# Altium footprint library pads.PcbLib: 25 footprints (part 1 of 2)
Each footprint in its own frame and in the unit in brackets; x right, y up, seen from the top. Pads: shape width x height; smd on the part's side, far side on the other; paste and mask are expansions set on the pad; w line width, h text height; cw(c..) or ccw(c..) is an arc to the next point about the centre after c.
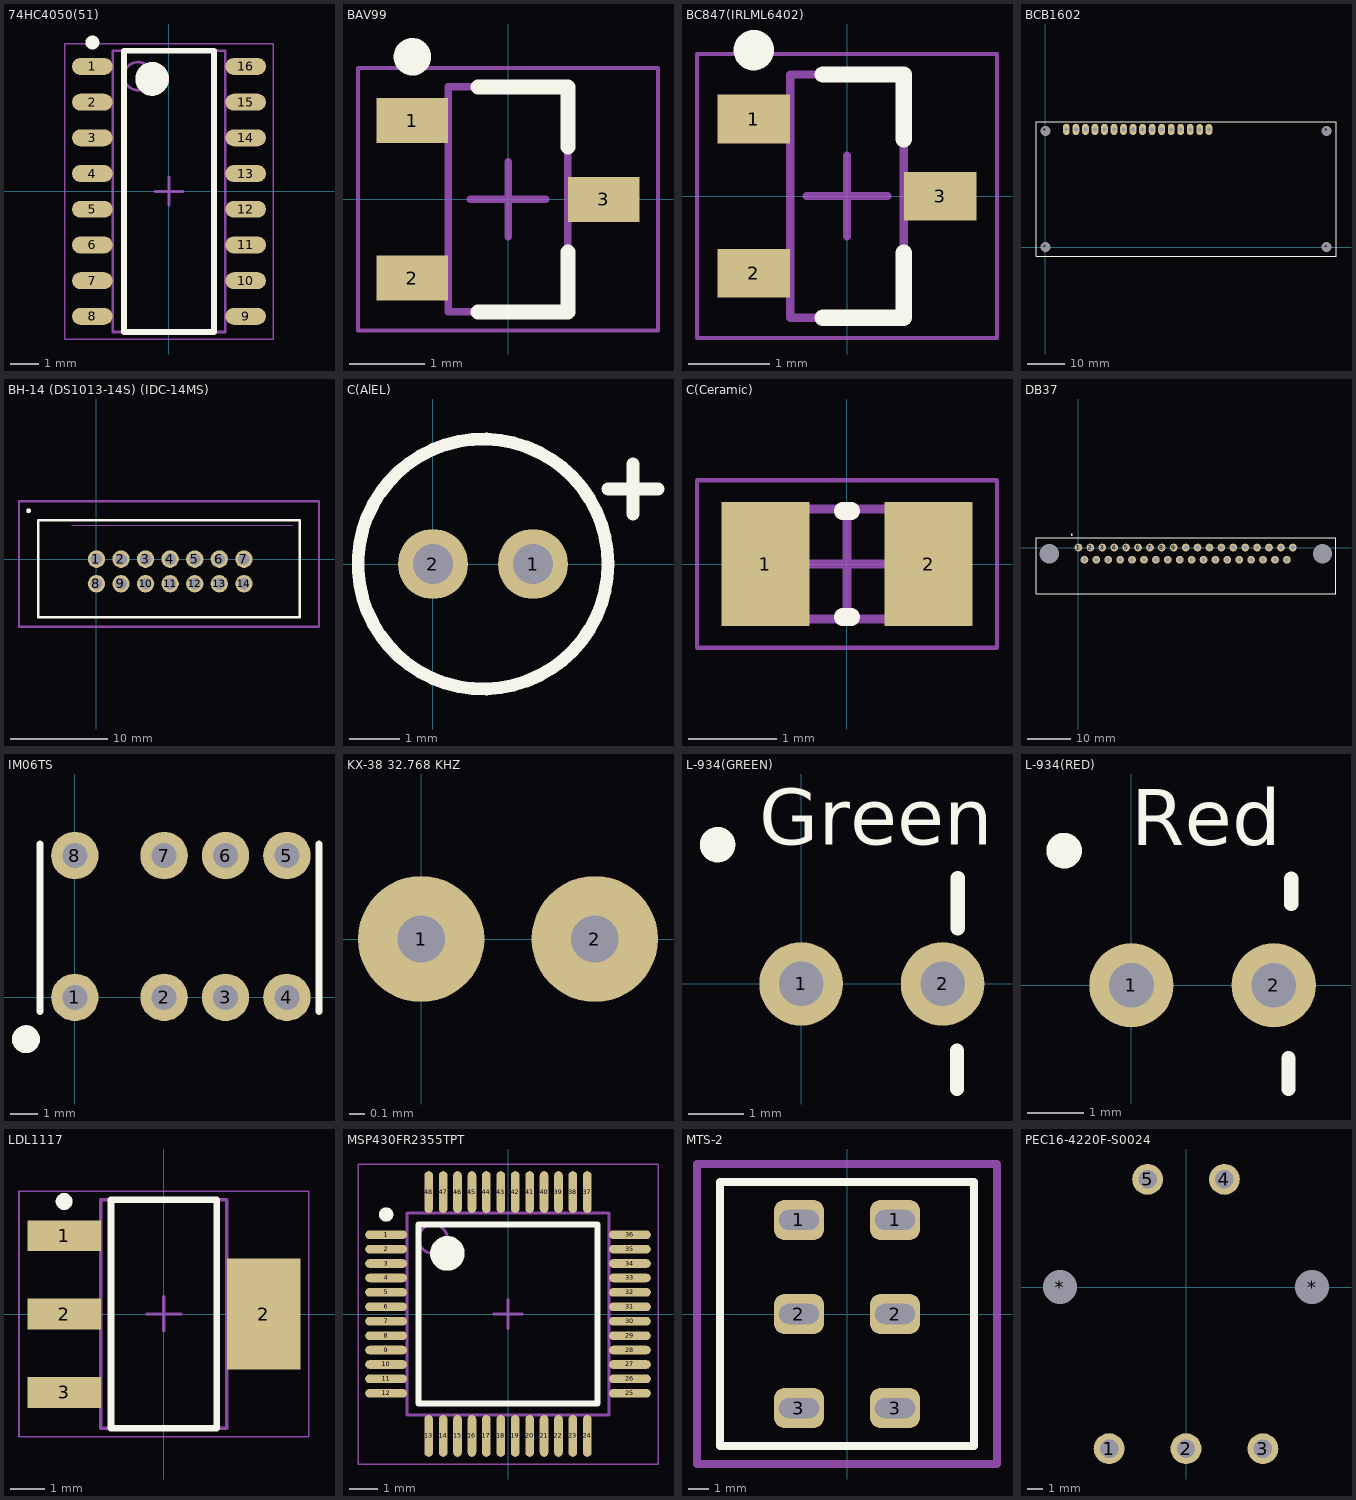
[diagram p0: the footprints below, top view; thin cyan lines are the x and y axes]

## 74HC4050(51) [mm]
height 1.8
pads (16):
  oval 1.45x0.6 smd: 1(-2.725,4.445) 2(-2.725,3.175) 3(-2.725,1.905) 4(-2.725,0.635) 5(-2.725,-0.635) 6(-2.725,-1.905) 7(-2.725,-3.175) 8(-2.725,-4.445) 9(2.725,-4.445) 10(2.725,-3.175) 11(2.725,-1.905) 12(2.725,-0.635) 13(2.725,0.635) 14(2.725,1.905) 15(2.725,3.175) 16(2.725,4.445)
Top Overlay:
  circle w0.25: c-2.725,5.295 r0.125
  circle w0.6: c-0.6,4 r0.3
  lines w0.2: -1.6,-5 -1.6,5 1.6,5 1.6,-5 -1.6,-5
Mechanical 13:
  circle w0.1: c-1.1,4.1 r0.5
  lines w0.1: -2,-5 -2,5 2,5 2,-5 -2,-5
Mechanical 15:
  lines w0.05: -3.7,-5.25 -3.7,5.25 3.7,5.25 3.7,-5.25 -3.7,-5.25
  lines w0.1: -0.5,0 0.5,0 ; 0,-0.5 0,0.5
3D body "SOIC127P600X175-16N.step": height 1.75, standoff 0, extent -3,-5 3,5

## BAV99 [mm] "SOT23, 3-Leads, Body 2,90x2,45mm, Pitch 1,05mm, IPC Medium Density"
height 1.3
pads (3):
  rect 0.95x0.6 smd: 1(-1.275,1.05) 2(-1.275,-1.05) 3(1.275,0)
Top Overlay:
  circle w0.25: c-1.275,1.9 r0.125
  lines w0.2: -0.4,-1.5 0.8,-1.5 0.8,-0.7 ; -0.4,1.5 0.8,1.5 0.8,0.7
Mechanical 13:
  lines w0.1: -0.8,-1.5 -0.8,1.5 0.8,1.5 0.8,-1.5 -0.8,-1.5
Mechanical 15:
  lines w0.05: -2,-1.75 -2,1.75 2,1.75 2,-1.75 -2,-1.75
  lines w0.1: -0.5,0 0.5,0 ; 0,-0.5 0,0.5
3D body "SOT105P245X130-3N.step": height 1.3, standoff 0, extent -1.4,-1.5 1.4,1.5

## BC847(IRLML6402) [mm] "SOT23, 3-Leads, Body 2,80x2,30mm, Pitch 0,95mm, IPC Medium Density"
height 1.1
pads (3):
  rect 0.9x0.6 smd: 1(-1.15,0.95) 2(-1.15,-0.95) 3(1.15,0)
Top Overlay:
  circle w0.25: c-1.15,1.8 r0.125
  lines w0.2: -0.3,-1.5 0.7,-1.5 0.7,-0.7 ; -0.3,1.5 0.7,1.5 0.7,0.7
Mechanical 13:
  lines w0.1: -0.7,-1.5 -0.7,1.5 0.7,1.5 0.7,-1.5 -0.7,-1.5
Mechanical 15:
  lines w0.05: -1.85,-1.75 -1.85,1.75 1.85,1.75 1.85,-1.75 -1.85,-1.75
  lines w0.1: -0.5,0 0.5,0 ; 0,-0.5 0,0.5
3D body "SOT95P230X110-3N.step": height 1.1, standoff 0, extent -1.3,-1.5 1.3,1.5

## BCB1602 [mm]
pads (20):
  oval 1.8x3 hole 1: 1(43.62,31.376) 2(41.16,31.377) 3(38.62,31.379) 4(36.08,31.381) 5(33.54,31.382) 6(31,31.384) 7(28.46,31.385) 8(25.92,31.387) 9(23.38,31.389) 10(20.84,31.39) 11(18.3,31.392) 12(15.76,31.394) 13(13.22,31.395) 14(10.68,31.397) 15(8.14,31.398) 16(5.6,31.4)
  round 2.5 hole 2.7 unplated: *(0,0) *(0,31) *(75,0) *(75,31)
Top Overlay:
  lines w0.2: -2.5,-2.5 -2.5,33.5 77.5,33.5 77.5,-2.5 -2.5,-2.5
3D body "User Library-LCD1602.step": height 17.05, standoff 5, extent -2.434,-2.551 77.566,33.449

## BH-14 (DS1013-14S) (IDC-14MS) [mm]
pads (14):
  round 1.8 hole 1.2: 1(0,0) 2(2.54,0) 3(5.08,0) 4(7.62,0) 5(10.16,0) 6(12.7,0) 7(15.24,0) 8(0,-2.54) 9(2.54,-2.54) 10(5.08,-2.54) 11(7.62,-2.54) 12(10.16,-2.54) 13(12.7,-2.54) 14(15.24,-2.54)
Top Overlay:
  circle w0.25: c-7,5 r0.125
  lines w0.254: -6,-6 -6,4 21,4 21,-6 -6,-6
Mechanical 15:
  lines w0: -2.54,3.5 20.3,3.5
  lines w0.254: -8,-7 23,-7 23,6 -8,6 -8,-7
3D body: height 6.5, standoff 1.5, extent 30.1,-2 30.1,-2
3D body "User Library-IDC-14MS.STEP": height 10.25, standoff -2.45, extent -5.1,-5.7 20.3,3.65

## C(AlEL) [mm]
pads (2):
  round 1.4 hole 0.8: 1(2,0) 2(0,0)
Top Overlay:
  circle w0.254: c1,0 r2.5
  lines w0.254: 3.5,1.5 4.5,1.5 ; 4,1 4,2
3D body "User Library-cap 5x11.STEP": height 12, standoff -18, extent -1.5,-2.5 3.5,2.5
3D body: height 8.25, standoff -8.25, extent 1.75,-2.75 1.75,-2.75
3D body: height 8.25, standoff -8.25, extent 4.5,-4 4.5,-4

## C(Ceramic) [mm] "Chip Capacitor, 2-Leads, Body 2,00x1,25mm, IPC Medium Density"
height 1.3
pads (2):
  rect 1x1.4 smd: 1(-0.925,0) 2(0.925,0)
Top Overlay:
  lines w0.2: -0.05,-0.6 0.05,-0.6 ; -0.05,0.6 0.05,0.6
Mechanical 13:
  lines w0.1: -1,-0.625 -1,0.625 1,0.625 1,-0.625 -1,-0.625
Mechanical 15:
  lines w0.05: -1.7,-0.95 -1.7,0.95 1.7,0.95 1.7,-0.95 -1.7,-0.95
  lines w0.1: -0.5,0 0.5,0 ; 0,-0.5 0,0.5
3D body "CAPC2012X13N.step": height 1.3, standoff 0, extent -1,-0.625 1,0.625

## DB37 [mm]
pads (39):
  round 1.8 hole 1: 1(0,0) 2(2.77,0) 3(5.54,0) 4(8.31,0) 5(11.08,0) 6(13.85,0) 7(16.62,0) 8(19.39,0) 9(22.16,0) 10(24.93,0) 11(27.7,0) 12(30.47,0) 13(33.24,0) 14(36.01,0) 15(38.78,0) 16(41.55,0) 17(44.32,0) 18(47.09,0) 19(49.86,0) 20(1.385,-2.84) 21(4.155,-2.84) 22(6.925,-2.84) 23(9.695,-2.84) 24(12.465,-2.84) 25(15.235,-2.84) 26(18.005,-2.84) 27(20.775,-2.84) 28(23.545,-2.84) 29(26.315,-2.84) 30(29.085,-2.84) 31(31.855,-2.84) 32(34.625,-2.84) 33(37.395,-2.84) 34(40.165,-2.84) 35(42.935,-2.84) 36(45.705,-2.84) 37(48.475,-2.84)
  round 1.6 hole 4.5 unplated: *(-6.775,-1.45) *(56.775,-1.475)
Top Overlay:
  circle w0.25: c-1.55,3.025 r0.125
  lines w0.254: -9.875,-10.8 59.9,-10.8 59.9,2.225 -9.825,2.225 -9.875,2.175 -9.875,-10.8
3D body "User Library-DBPN1M-37.step": height 12.55, standoff -4.82, extent -9.775,-17.112 59.725,2.062

## IM06TS [mm]
pads (8):
  round 1.7 hole 0.9: 1(0,0) 2(3.2,0) 3(5.4,0) 4(7.6,0) 5(7.6,5.08) 6(5.4,5.08) 7(3.2,5.08) 8(0,5.08)
Top Overlay:
  circle w0.5: c-1.75,-1.5 r0.25
  lines w0.254: -1.25,-0.5 -1.25,5.5 ; 8.75,-0.5 8.75,5.5
3D body "User Library-L10,1_B06,1_H05,9_A02,20.step": height 5.4, standoff -3.45, extent -1.25,-0.5 8.75,5.5

## KX-38 32.768 KHZ [mm]
pads (2):
  round 0.8 hole 0.3: 1(0,0) 2(1.1,0)

## L-934(GREEN) [mm]
pads (2):
  round 1.5 hole 0.8: 1(0,0) 2(2.54,0)
Top Overlay:
  circle w0.354: c-1.5,2.5 r0.141
  lines w0.254: 2.8,-1.887 2.8,-1.2 ; 2.813,1 2.813,1.9
  text "Green" at -0.75,2.5 h1
3D body: height 6.5, standoff 1.5, extent 1.285,0 1.285,0
3D body: height 6.5, standoff 1.5, extent 1.285,0 1.285,0
3D body: height 6.5, standoff 1.5, extent 1.285,0 1.285,0
3D body: height 6.5, standoff 1.5, extent 1.285,0 1.285,0
3D body: height 6.5, standoff 1.5, extent 0.25,0.25 0.25,0.25
3D body: height 6.5, standoff 1.5, extent 0,0 0,0
3D body: height 8.25, standoff -8.25, extent -0.5,3 -0.5,3
3D body "everlight-3MM-LED-GREEN.step": height 5.64, standoff -6.93, extent -0.613,-1.9 2.813,1.9

## L-934(RED) [mm]
pads (2):
  round 1.5 hole 0.8: 1(0,0) 2(2.54,0)
Top Overlay:
  circle w0.354: c-1.2,2.4 r0.141
  lines w0.254: 2.8,-1.85 2.8,-1.3 ; 2.85,1.45 2.85,1.9
  text "Red" at 0,2.5 h1
3D body: height 6.5, standoff 1.5, extent 0,0 0,0
3D body: height 6.5, standoff 1.5, extent 0.25,0.25 0.25,0.25
3D body: height 6.5, standoff 1.5, extent 1.285,0 1.285,0
3D body: height 6.5, standoff 1.5, extent 1.285,0 1.285,0
3D body: height 6.5, standoff 1.5, extent 1.285,0 1.285,0
3D body: height 6.5, standoff 1.5, extent 1.285,0 1.285,0
3D body "CircuitWorks-LED DIP 3MM.step": height 6, standoff -2.5, extent -0.65,-1.9 2.85,1.9
3D body: height 8.25, standoff -8.25, extent -0.5,3 -0.5,3

## LDL1117 [mm]
height 1.8
pads (4):
  rect 2.15x0.9 smd: 1(-2.925,2.3) 2(-2.925,0) 3(-2.925,-2.3)
  rect 2.15x3.25 smd: 2(2.925,0)
Top Overlay:
  circle w0.25: c-2.925,3.3 r0.125
  lines w0.2: -1.55,-3.35 -1.55,3.35 1.55,3.35 1.55,-3.35 -1.55,-3.35
Mechanical 13:
  lines w0.1: -1.85,-3.35 -1.85,3.35 1.85,3.35 1.85,-3.35 -1.85,-3.35
Mechanical 15:
  lines w0.05: -4.25,-3.6 -4.25,3.6 4.25,3.6 4.25,-3.6 -4.25,-3.6
  lines w0.1: -0.5,0 0.5,0 ; 0,-0.5 0,0.5
3D body "SOT230P700X180-4N.step": height 1.8, standoff 0, extent -3.5,-3.35 3.5,3.35

## MSP430FR2355TPT [mm] "TSQFP, 48-Leads, Body 7,00x7,00mm, Pitch 0,50mm, IPC Medium Density"
height 1.6
pads (48):
  oval 1.45x0.3 smd: 1(-4.225,2.75) 2(-4.225,2.25) 3(-4.225,1.75) 4(-4.225,1.25) 5(-4.225,0.75) 6(-4.225,0.25) 7(-4.225,-0.25) 8(-4.225,-0.75) 9(-4.225,-1.25) 10(-4.225,-1.75) 11(-4.225,-2.25) 12(-4.225,-2.75) 25(4.225,-2.75) 26(4.225,-2.25) 27(4.225,-1.75) 28(4.225,-1.25) 29(4.225,-0.75) 30(4.225,-0.25) 31(4.225,0.25) 32(4.225,0.75) 33(4.225,1.25) 34(4.225,1.75) 35(4.225,2.25) 36(4.225,2.75)
  oval 0.3x1.45 smd: 13(-2.75,-4.225) 14(-2.25,-4.225) 15(-1.75,-4.225) 16(-1.25,-4.225) 17(-0.75,-4.225) 18(-0.25,-4.225) 19(0.25,-4.225) 20(0.75,-4.225) 21(1.25,-4.225) 22(1.75,-4.225) 23(2.25,-4.225) 24(2.75,-4.225) 37(2.75,4.225) 38(2.25,4.225) 39(1.75,4.225) 40(1.25,4.225) 41(0.75,4.225) 42(0.25,4.225) 43(-0.25,4.225) 44(-0.75,4.225) 45(-1.25,4.225) 46(-1.75,4.225) 47(-2.25,4.225) 48(-2.75,4.225)
Top Overlay:
  circle w0.25: c-4.225,3.45 r0.125
  circle w0.6: c-2.1,2.1 r0.3
  lines w0.2: -3.1,-3.1 -3.1,3.1 3.1,3.1 3.1,-3.1 -3.1,-3.1
Mechanical 13:
  circle w0.1: c-2.6,2.6 r0.5
  lines w0.1: -3.5,-3.5 -3.5,3.5 3.5,3.5 3.5,-3.5 -3.5,-3.5
Mechanical 15:
  lines w0.05: -5.2,-5.2 -5.2,5.2 5.2,5.2 5.2,-5.2 -5.2,-5.2
  lines w0.1: -0.5,0 0.5,0 ; 0,-0.5 0,0.5
3D body "TSQFP50P900X900X160-48N.step": height 1.6, standoff 0, extent -4.5,-4.5 4.5,4.5

## MTS-2 [mm]
pads (6):
  rrect50% 2.5x2 hole 1 slot 2 at 0 deg: 1(-2.4,4.7) 1(2.4,4.7) 2(-2.4,0) 2(2.4,0) 3(-2.4,-4.7) 3(2.4,-4.7)
Top Overlay:
  lines w0.4: -6.35,-6.6 -6.35,6.6 6.35,6.6 6.35,-6.6 -6.35,-6.6
Mechanical 15:
  lines w0.4: -7.5,-7.5 -7.5,6.6 -7.5,7.5 7.5,7.5 7.5,-7.5 -7.5,-7.5
3D body "User Library-MTS-20x-A2.step": height 29.34, standoff -5.3, extent -6.35,-6.6 6.35,6.6

## PEC16-4220F-S0024 [mm]
pads (7):
  round 2 hole 1.2: 1(-5,-10.5) 2(0,-10.5) 3(5,-10.5) 4(2.5,7) 5(-2.5,7)
  round 2 hole 2.2 unplated: *(-8.2,0) *(8.2,0)
3D body "User Library-Encoder PEC16-4220F-S0024 BOURNS.step": height 28.3, standoff -3.2, extent -8.25,-12.5 8.25,8.3